# Altium footprint library 2.04-SOT封装.PcbLib: 32 footprints (part 1 of 2)
Each footprint in its own frame and in the unit in brackets; x right, y up, seen from the top. Pads: shape width x height; smd on the part's side, far side on the other; paste and mask are expansions set on the pad; w line width, h text height; cw(c..) or ccw(c..) is an arc to the next point about the centre after c.
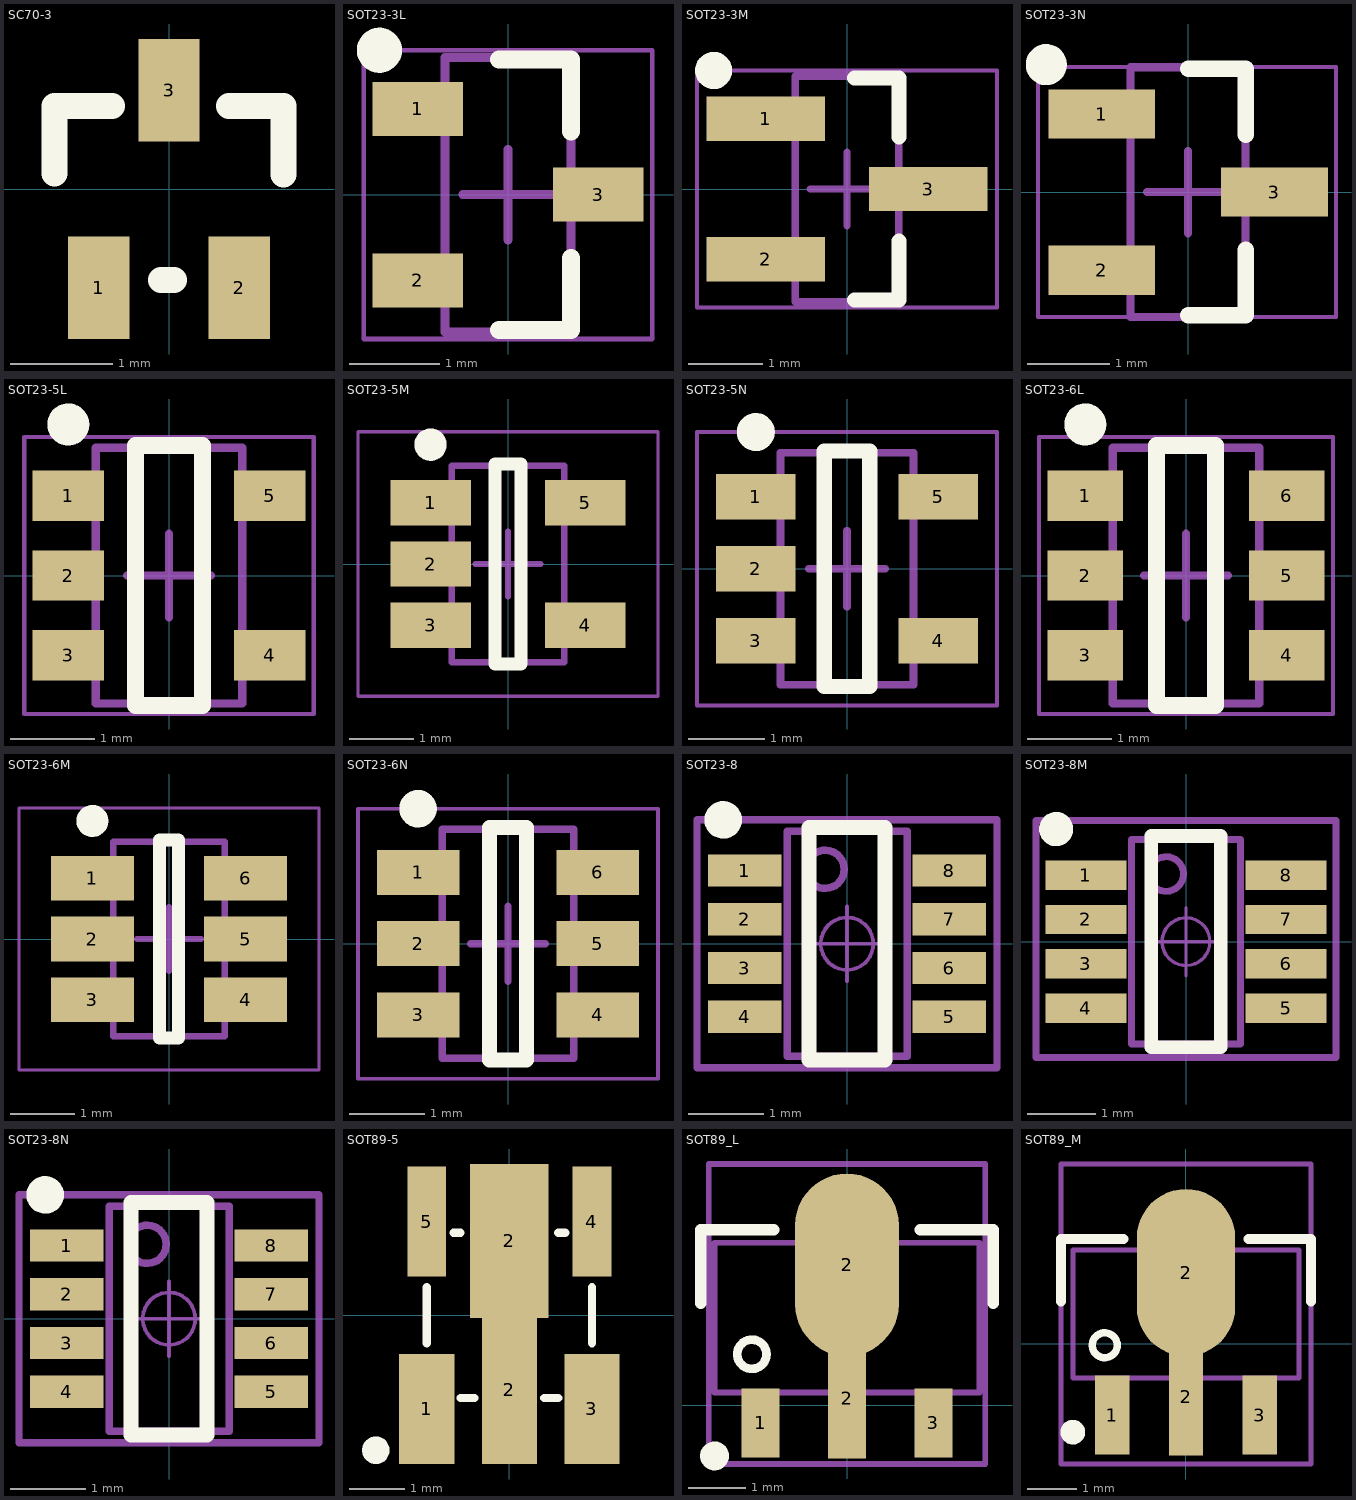
[diagram p0: the footprints below, top view; thin cyan lines are the x and y axes]

## SC70-3 [mm] "封装库来自淘宝卖家 ID：黄晶宝石"
pads (3):
  rect 0.6x1 smd: 1(-0.686,-0.965) 2(0.686,-0.965) 3(0,0.965)
Top Overlay:
  lines w0.254: -1.118,0.152 -1.118,0.813 -0.559,0.813 ; -0.076,-0.889 0.051,-0.889 ; 0.584,0.813 1.118,0.813 1.118,0.143
3D body "SOT323_sc70-3.STEP": height 1.1, standoff 0, extent -1.15,-1.072 1.05,1.173

## SOT23-3L [mm] "SOT23, 3-Leads, Body 2.9x1.3mm, Pitch 0.95mm, Lead Span 2.4mm, IPC High Density"
height 1.12
pads (3):
  rect 1x0.6 smd: 1(-1,0.95) 2(-1,-0.95) 3(1,0)
Top Overlay:
  circle w0.25: c-1.425,1.6 r0.125
  lines w0.2: -0.1,-1.5 0.7,-1.5 0.7,-0.7 ; -0.1,1.5 0.7,1.5 0.7,0.7
Mechanical 13:
  lines w0.1: -0.7,-1.52 0.7,-1.52 0.7,1.52 -0.7,1.52 -0.7,-1.52
Mechanical 15:
  lines w0.05: -1.6,-1.6 1.6,-1.6 1.6,1.6 -1.6,1.6 -1.6,-1.6
  lines w0.1: -0.5,0 0.5,0 ; 0,-0.5 0,0.5
3D body "SOT23-3-2.STEP": height 1.05, standoff 0, extent -1.2,-1.5 1.2,1.5

## SOT23-3M [mm] "SOT23, 3-Leads, Body 2.9x1.3mm, Pitch 0.95mm, Lead Span 2.4mm, IPC Low Density"
height 1.12
pads (3):
  rect 1.6x0.6 smd: 1(-1.1,0.95) 2(-1.1,-0.95) 3(1.1,0)
Top Overlay:
  circle w0.25: c-1.8,1.6 r0.125
  lines w0.2: 0.1,-1.5 0.7,-1.5 0.7,-0.7 ; 0.1,1.5 0.7,1.5 0.7,0.7
Mechanical 13:
  lines w0.1: -0.7,-1.52 -0.7,1.52 0.7,1.52 0.7,-1.52 -0.7,-1.52
Mechanical 15:
  lines w0.05: -2.025,-1.6 2.025,-1.6 2.025,1.6 -2.025,1.6 -2.025,-1.6
  lines w0.1: -0.5,0 0.5,0 -0.5,0 ; 0,-0.5 0,0.5 0,-0.5
3D body "SOT-23-3-20.STEP": height 1.2, standoff 0, extent -1.4,-1.45 1.4,1.45

## SOT23-3N [mm] "SOT23, 3-Leads, Body 2.9x1.3mm, Pitch 0.95mm, Lead Span 2.4mm, IPC Medium Density"
height 1.12
pads (3):
  rect 1.3x0.6 smd: 1(-1.05,0.95) 2(-1.05,-0.95) 3(1.05,0)
Top Overlay:
  circle w0.25: c-1.725,1.55 r0.125
  lines w0.2: 0,-1.5 0.7,-1.5 0.7,-0.7 ; 0,1.5 0.7,1.5 0.7,0.7
Mechanical 13:
  lines w0.1: -0.7,-1.52 0.7,-1.52 0.7,1.52 -0.7,1.52 -0.7,-1.52
Mechanical 15:
  lines w0.05: -1.825,-1.52 -1.825,1.52 1.8,1.52 1.8,-1.52 -1.825,-1.52
  lines w0.1: -0.5,0 0.5,0 ; 0,-0.5 0,0.5
3D body "SOT23-3-2.STEP": height 1.05, standoff 0, extent -1.2,-1.5 1.2,1.5

## SOT23-5L [mm] "SOT23, 5-Leads, Body 2.9x1.6mm, Pitch 0.95mm, IPC High Density"
height 1.1
pads (5):
  rect 0.85x0.6 smd: 1(-1.2,0.95) 2(-1.2,0) 3(-1.2,-0.95) 4(1.2,-0.95) 5(1.2,0.95)
Top Overlay:
  circle w0.25: c-1.2,1.8 r0.125
  lines w0.2: -0.4,-1.55 -0.4,1.55 0.4,1.55 0.4,-1.55 -0.4,-1.55
Mechanical 13:
  lines w0.1: -0.875,-1.525 0.875,-1.525 0.875,1.525 -0.875,1.525 -0.875,-1.525
Mechanical 15:
  lines w0.05: -1.725,-1.65 1.725,-1.65 1.725,1.65 -1.725,1.65 -1.725,-1.65
  lines w0.1: -0.5,0 0.5,0 ; 0,-0.5 0,0.5
3D body "SOT23-5-2.STEP": height 1.15, standoff -0.03, extent -1.403,-1.5 1.404,1.5

## SOT23-5M [mm] "SOT23, 5-Leads, Body 2.9x1.6mm, Pitch 0.95mm, IPC Low Density"
height 1.1
pads (5):
  rect 1.25x0.7 smd: 1(-1.2,0.95) 2(-1.2,0) 3(-1.2,-0.95) 4(1.2,-0.95) 5(1.2,0.95)
Top Overlay:
  circle w0.25: c-1.2,1.85 r0.125
  lines w0.2: -0.2,-1.55 -0.2,1.55 0.2,1.55 0.2,-1.55 -0.2,-1.55
Mechanical 13:
  lines w0.1: -0.875,-1.525 0.875,-1.525 0.875,1.525 -0.875,1.525 -0.875,-1.525
Mechanical 15:
  lines w0.05: -2.325,-2.05 2.325,-2.05 2.325,2.05 -2.325,2.05 -2.325,-2.05
  lines w0.1: -0.5,0 0.5,0 ; 0,-0.5 0,0.5
3D body "SOT23-5-2.STEP": height 1.15, standoff -0.03, extent -1.403,-1.5 1.404,1.5

## SOT23-5N [mm] "SOT23, 5-Leads, Body 2.9x1.6mm, Pitch 0.95mm, IPC Medium Density"
height 1.1
pads (5):
  rect 1.05x0.6 smd: 1(-1.2,0.95) 2(-1.2,0) 3(-1.2,-0.95) 4(1.2,-0.95) 5(1.2,0.95)
Top Overlay:
  circle w0.25: c-1.2,1.8 r0.125
  lines w0.2: -0.3,-1.55 -0.3,1.55 0.3,1.55 0.3,-1.55 -0.3,-1.55
Mechanical 13:
  lines w0.1: -0.875,-1.525 0.875,-1.525 0.875,1.525 -0.875,1.525 -0.875,-1.525
Mechanical 15:
  lines w0.05: -1.975,-1.8 1.975,-1.8 1.975,1.8 -1.975,1.8 -1.975,-1.8
  lines w0.1: -0.5,0 0.5,0 ; 0,-0.5 0,0.5
3D body "SOT23-5-2.STEP": height 1.15, standoff -0.03, extent -1.403,-1.5 1.404,1.5

## SOT23-6L [mm] "SOT-23, 6-Leads, Body 2.90x1.60mm, Pitch 0.95mm, IPC High Density"
height 1.45
pads (6):
  rect 0.9x0.6 smd: 1(-1.2,0.95) 2(-1.2,0) 3(-1.2,-0.95) 4(1.2,-0.95) 5(1.2,0) 6(1.2,0.95)
Top Overlay:
  circle w0.25: c-1.2,1.8 r0.125
  lines w0.2: -0.35,-1.55 -0.35,1.55 0.35,1.55 0.35,-1.55 -0.35,-1.55
Mechanical 13:
  lines w0.1: -0.875,-1.525 0.875,-1.525 0.875,1.525 -0.875,1.525 -0.875,-1.525
Mechanical 15:
  lines w0.05: -1.75,-1.65 1.75,-1.65 1.75,1.65 -1.75,1.65 -1.75,-1.65
  lines w0.1: -0.5,0 0.5,0 ; 0,-0.5 0,0.5
3D body "SOT23-6.STEP": height 1.15, standoff -0.03, extent -1.403,-1.5 1.404,1.5

## SOT23-6M [mm] "SOT-23, 6-Leads, Body 2.90x1.60mm, Pitch 0.95mm, IPC Low Density"
height 1.45
pads (6):
  rect 1.3x0.7 smd: 1(-1.2,0.95) 2(-1.2,0) 3(-1.2,-0.95) 4(1.2,-0.95) 5(1.2,0) 6(1.2,0.95)
Top Overlay:
  circle w0.25: c-1.2,1.85 r0.125
  lines w0.2: -0.15,-1.55 -0.15,1.55 0.15,1.55 0.15,-1.55 -0.15,-1.55
Mechanical 13:
  lines w0.1: -0.875,-1.525 0.875,-1.525 0.875,1.525 -0.875,1.525 -0.875,-1.525
Mechanical 15:
  lines w0.05: -2.35,-2.05 2.35,-2.05 2.35,2.05 -2.35,2.05 -2.35,-2.05
  lines w0.1: -0.5,0 0.5,0 ; 0,-0.5 0,0.5
3D body "SOT23-6.STEP": height 1.15, standoff -0.03, extent -1.403,-1.5 1.404,1.5

## SOT23-6N [mm] "SOT-23, 6-Leads, Body 2.90x1.60mm, Pitch 0.95mm, IPC Medium Density"
height 1.45
pads (6):
  rect 1.1x0.6 smd: 1(-1.2,0.95) 2(-1.2,0) 3(-1.2,-0.95) 4(1.2,-0.95) 5(1.2,0) 6(1.2,0.95)
Top Overlay:
  circle w0.25: c-1.2,1.8 r0.125
  lines w0.2: -0.25,-1.55 0.25,-1.55 0.25,1.55 -0.25,1.55 -0.25,-1.55
Mechanical 13:
  lines w0.1: -0.875,-1.525 -0.875,1.525 0.875,1.525 0.875,-1.525 -0.875,-1.525
Mechanical 15:
  lines w0.05: -2,-1.8 -2,1.8 2,1.8 2,-1.8 -2,-1.8
  lines w0.1: -0.5,0 0.5,0 ; 0,-0.5 0,0.5
3D body "SOT23-6.STEP": height 1.15, standoff -0.03, extent -1.403,-1.5 1.404,1.5

## SOT23-8 [mil] "SOT23, 8-Leads, Body 2.9x1.75mm, Pitch 0.65mm"
pads (8):
  rect 38.5x17 smd paste+0: 1(-53.75,38.39) 2(-53.75,12.8) 3(-53.75,-12.8) 4(-53.75,-38.39) 5(53.75,-38.39) 6(53.75,-12.8) 7(53.75,12.8) 8(53.75,38.39)
Top Overlay:
  circle w9.84: c-64.99,64.99 r4.92
  lines w7.87: -19.99,-61.04 -19.99,61.01 20.01,61.01 20.01,-61.04 -19.99,-61.04
Mechanical 13:
  circle w3.94: c-11.49,39.04 r10
  lines w3.94: -31.48,-59.06 31.51,-59.06 31.51,59.05 -31.48,59.05 -31.48,-59.06
Mechanical 15:
  circle w1.97: c0.01,-0.01 r13.78
  lines w1.97: -19.68,-0.01 19.69,-0.01 ; 0.01,-19.7 0.01,19.67
  lines w3.94: -78.74,-65.01 78.74,-65.01 78.74,64.99 -78.74,64.99 -78.74,-65.01
3D body "SOT23-8.STEP": height 47.28, standoff 2, extent -55.24,-59.07 55.26,59.04

## SOT23-8M [mil] "SOT23, 8-Leads, Body 2.9x1.75mm, Pitch 0.65mm"
pads (8):
  rect 46.5x17 smd paste+0: 1(-57.75,38.39) 2(-57.75,12.8) 3(-57.75,-12.8) 4(-57.75,-38.39) 5(57.75,-38.39) 6(57.75,-12.8) 7(57.75,12.8) 8(57.75,38.39)
Top Overlay:
  circle w9.84: c-75,64.99 r4.92
  lines w7.87: -20,-61.03 -20,61.02 20,61.02 20,-61.03 -20,-61.03
Mechanical 13:
  circle w3.94: c-11.5,39.05 r10
  lines w3.94: -31.49,-59.06 31.51,-59.06 31.51,59.05 -31.49,59.05 -31.49,-59.06
Mechanical 15:
  circle w1.97: c0,-0.01 r13.78
  lines w1.97: -19.68,-0.01 19.68,-0.01 ; 0,-19.69 0,19.68
  lines w3.94: -86.61,-66.93 86.61,-66.93 86.61,69.99 -86.61,69.99 -86.61,-66.93
3D body "SOT23-8.STEP": height 45.28, standoff 0, extent -55.25,-59.06 55.26,59.05

## SOT23-8N [mil] "SOT23, 8-Leads, Body 2.9x1.75mm, Pitch 0.65mm."
pads (8):
  rect 38.5x17 smd paste+0: 1(-53.75,38.39) 2(-53.75,12.8) 3(-53.75,-12.8) 4(-53.75,-38.39) 5(53.75,-38.39) 6(53.75,-12.8) 7(53.75,12.8) 8(53.75,38.39)
Top Overlay:
  circle w9.84: c-64.99,64.99 r4.92
  lines w7.87: -19.99,-61.04 -19.99,61.01 20.01,61.01 20.01,-61.04 -19.99,-61.04
Mechanical 13:
  circle w3.94: c-11.49,39.04 r10
  lines w3.94: -31.48,-59.06 31.51,-59.06 31.51,59.05 -31.48,59.05 -31.48,-59.06
Mechanical 15:
  circle w1.97: c0.01,-0.01 r13.78
  lines w1.97: -19.68,-0.01 19.69,-0.01 ; 0.01,-19.7 0.01,19.67
  lines w3.94: -78.74,-65.01 78.74,-65.01 78.74,64.99 -78.74,64.99 -78.74,-65.01
3D body "SOT23-8.STEP": height 47.28, standoff 2, extent -55.24,-59.05 55.26,59.06

## SOT89-5 [mm] "封装库来自淘宝卖家 ID：黄晶宝石"
pads (6):
  rect 1x2 smd: 1(-1.5,-1.7) 3(1.5,-1.7)
  rect 1x2.7 smd: 2(0,-1.35)
  rect 1.422x2.794 smd: 2(0,1.35)
  rect 0.7x2 smd: 4(1.5,1.7) 5(-1.5,1.7)
Top Overlay:
  circle w0.25: c-2.425,-2.45 r0.125
  lines w0.15: -1.5,-0.508 -1.5,0.508 ; -1.016,1.5 -0.889,1.5 ; -0.889,-1.5 -0.635,-1.5 ; 0.635,-1.5 0.889,-1.5 ; 0.889,1.5 1.016,1.5 ; 1.5,-0.508 1.5,0.508
3D body "SW3dPS-SOT895-A-PKG.STEP": height 1.51, standoff 0.01, extent -2.25,-1.9 2.25,1.9

## SOT89_L [mm] "4.6x4.3x1.6mm(长宽高)"
height 1.6
pads (4):
  rect 0.66x1.2 smd: 1(-1.5,-0.303) 3(1.5,-0.303)
  rect 0.66x2.1 smd: 2(0,0.127)
  oval 1.8x3.175 smd: 2(0,2.441)
Top Overlay:
  circle w0.15: c-1.651,0.889 r0.254
  circle w0.25: c-2.3,-0.876 r0.125
  lines w0.2: -2.54,1.778 -2.54,3.048 -1.27,3.048 ; 1.27,3.048 2.54,3.048 2.54,1.778
Mechanical 13:
  circle w0.1: c-1.651,0.889 r0.25
  lines w0.1: -2.3,0.224 -2.3,2.824 2.3,2.824 2.3,0.224 -2.3,0.224
Mechanical 15:
  circle w0.05: c0,1.524 r0.35
  lines w0.05: -0.5,1.524 0.5,1.524 ; 0,1.024 0,2.024
  lines w0.1: -2.4,-1.016 -2.4,4.191 2.4,4.191 2.4,-1.016 -2.4,-1.016
3D body "SOT89.STEP": height 1.6, standoff 0.04, extent -2.3,-0.825 2.3,3.475

## SOT89_M [mm] "4.6x4.3x1.6mm(长宽高)"
height 1.6
pads (4):
  rect 0.7x1.6 smd: 1(-1.5,-1.448) 3(1.5,-1.448)
  rect 0.7x2.4 smd: 2(0,-1.071)
  oval 2x3.4 smd: 2(0,1.448)
Top Overlay:
  circle w0.25: c-2.3,-1.794 r0.125
  circle w0.15: c-1.651,-0.029 r0.254
  lines w0.2: -2.54,0.86 -2.54,2.13 -1.27,2.13 ; 1.27,2.13 2.54,2.13 2.54,0.86
Mechanical 13:
  circle w0.1: c-1.651,-0.029 r0.25
  lines w0.1: -2.3,-0.694 2.3,-0.694 2.3,1.906 -2.3,1.906 -2.3,-0.694
Mechanical 15:
  circle w0.05: c0,0.606 r0.35
  lines w0.05: -0.5,0.606 0.5,0.606 ; 0,0.106 0,1.106
  lines w0.1: -2.54,-2.442 -2.54,3.654 2.54,3.654 2.54,-2.442 -2.54,-2.442
3D body "SOT89.STEP": height 1.6, standoff 0.04, extent -2.275,-1.775 2.325,2.525